# Altium footprint library 2.52-直插元件.PcbLib: 467 footprints (part 14 of 30)
Each footprint in its own frame and in the unit in brackets; x right, y up, seen from the top. Pads: shape width x height; smd on the part's side, far side on the other; paste and mask are expansions set on the pad; w line width, h text height; cw(c..) or ccw(c..) is an arc to the next point about the centre after c.
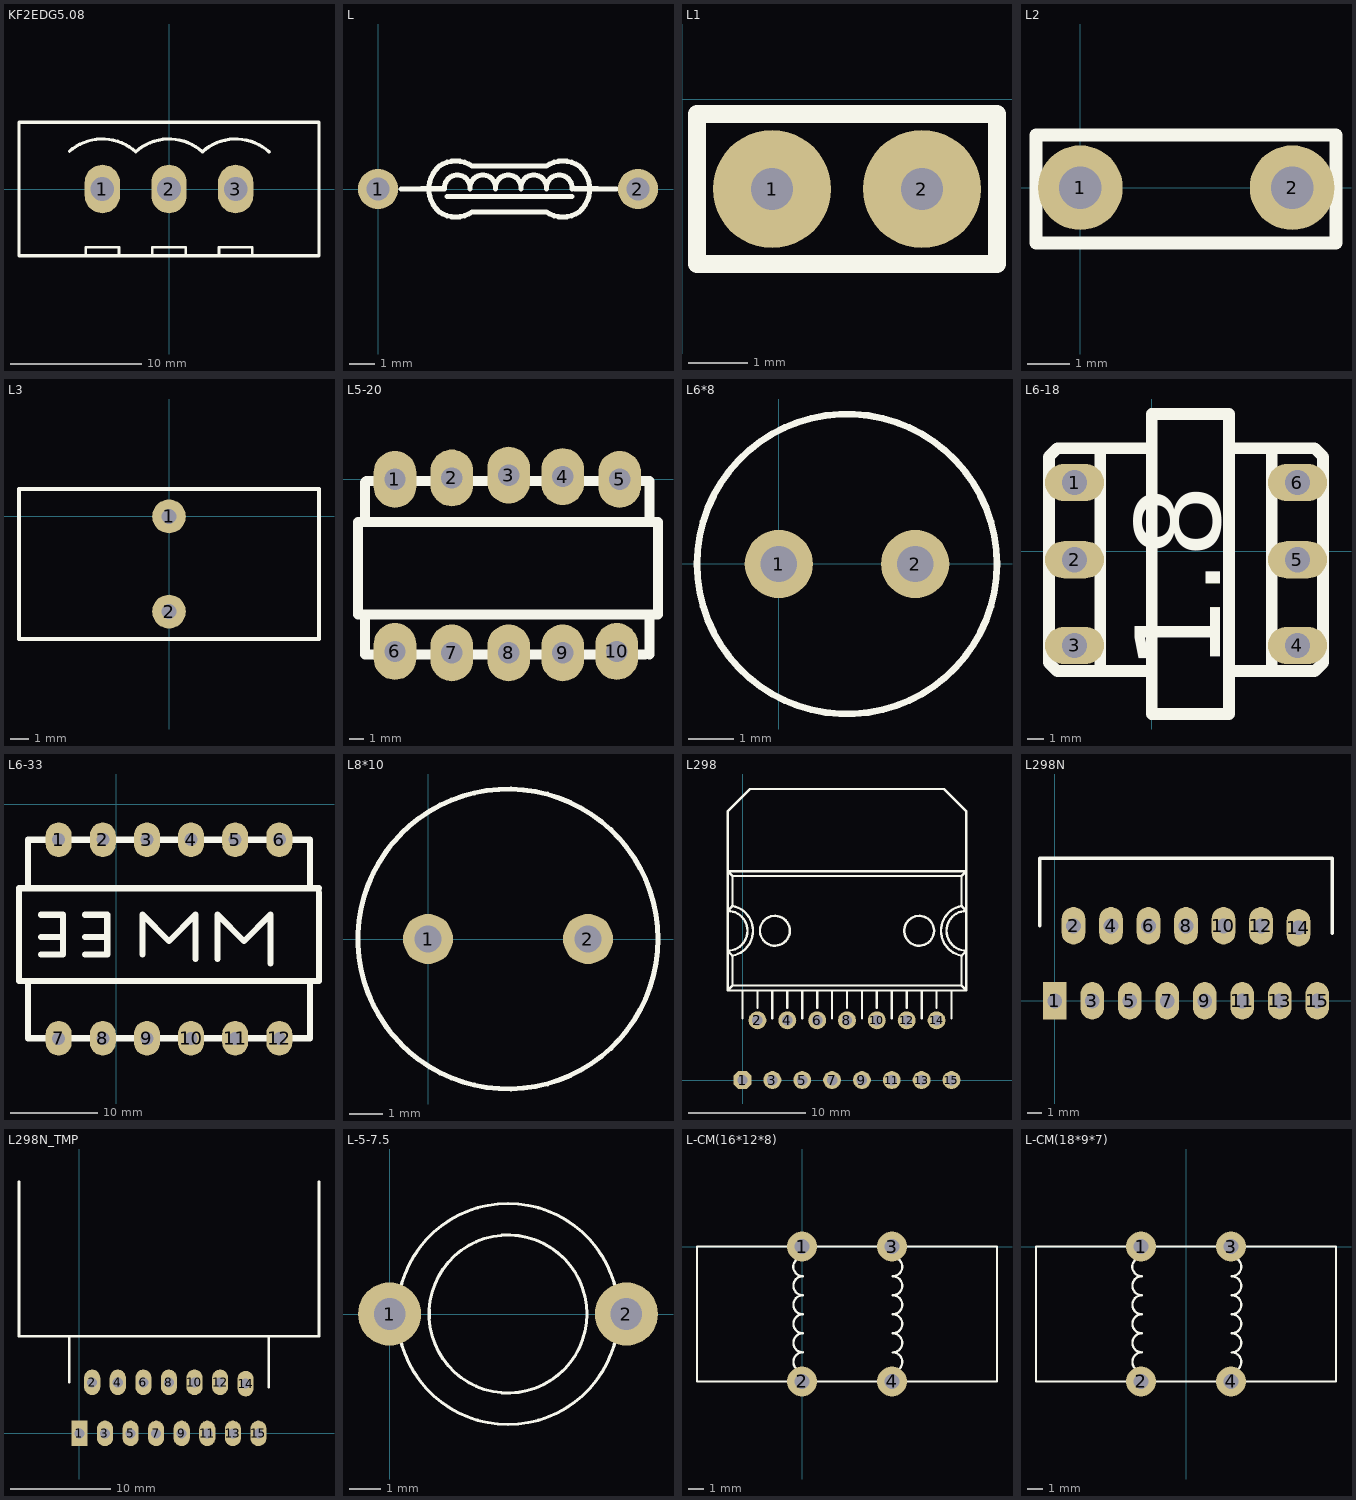
[diagram p13: the footprints below, top view; thin cyan lines are the x and y axes]

## KF2EDG5.08 [mm] "5.08mm端子"
height 12.7
pads (3):
  oval 2.7x3.7 hole 1.8: 1(-5.08,0) 2(0,0) 3(5.08,0)
Top Overlay:
  lines w0.2: -6.35,-5.08 -6.35,-4.445 -3.81,-4.445 -3.81,-5.08 ; -1.27,-5.08 -1.27,-4.445 1.27,-4.445 1.27,-5.08 ; 3.81,-5.08 3.81,-4.445 6.35,-4.445 6.35,-5.08
  lines w0.254: -7.58,2.875 cw(c-5.08,0) -2.517,2.819 ; -2.538,2.842 cw(c0,0) 2.563,2.819 ; 2.542,2.842 cw(c5.08,0) 7.643,2.819 ; -11.43,-5.08 -11.43,5.08 11.43,5.08 11.43,-5.08 -11.43,-5.08

## L [mil]
pads (2):
  round 62 hole 36: 1(0,0) 2(401.57,0)
Top Overlay:
  lines w7.87: 35.75,0 75.75,0 ; 67.32,0.39 102.76,0.39 cw(c122.44,1.97) 142.13,0.39 cw(c161.81,1.97) 181.5,0.39 cw(c201.18,1.97) 220.87,0.39 cw(c240.55,1.97) 260.24,0.39 cw(c279.92,1.97) 299.61,0.39 ; 106.69,-11.42 299.61,-11.42 ; 303.54,0.39 338.98,0.39 ; 328.19,0 368.19,0 ; 94.49,-35.43 cw(c125.98,0) 94.49,35.43 cw(c120.08,-1.97) 145.67,35.43 259.84,35.43 cw(c285.43,-1.97) 311.02,35.43 cw(c279.56,0) 311.02,-35.43 cw(c285.43,1.94) 259.84,-35.43 145.67,-35.43 cw(c120.08,1.94) 94.49,-35.43

## L1 [mil]
pads (2):
  round 78.74 hole 28: 1(60,-60) 2(160,-60)
Top Overlay:
  lines w12: 10,-110 210,-110 210,-10 10,-10 10,-110

## L2 [mm]
pads (2):
  round 2 hole 1: 1(0,0) 2(5,0)
Top Overlay:
  lines w0.305: -1.046,-1.3 -1.046,1.24 6.034,1.24 6.034,-1.3 -1.046,-1.3

## L3 [mm]
pads (2):
  round 1.8 hole 0.8: 1(0,0) 2(0,-5.08)
Top Overlay:
  lines w0.2: -8,-6.54 -8,1.46 8,1.46 8,-6.54 0,-6.54 -8,-6.54

## L5-20 [mm]
pads (10):
  oval 3x4 hole 1.5: 1(-23.2,0) 2(-19.2,0.1) 3(-15.2,0.3) 4(-11.4,0.2) 5(-7.4,0) 6(-23.2,-12.1) 7(-19.2,-12.2) 8(-15.2,-12.2) 9(-11.4,-12.2) 10(-7.6,-12.1)
Top Overlay:
  lines w0.7: -25.3,-9.5 -25.3,-12.3 -5.6,-12.3 ; -25.3,-3 -25.3,-0.2 -25.2,-0.1 -5.3,-0.1 -5.3,-3 ; -5.3,-12.3 -5.3,-9.5 ; -25.8,-9.5 -25.8,-3 ; -25.8,-9.5 -4.7,-9.5 ; -25.8,-9.5 -25.8,-3 ; -25.8,-3 -4.7,-3 ; -4.7,-9.5 -4.7,-3 ; -4.7,-9.5 -4.7,-3

## L6*8 [mm]
pads (2):
  round 1.5 hole 0.8: 1(0,0) 2(3,0)
Top Overlay:
  circle w0.15: c1.5,0 r3.3
3D body "6-8.STEP": height 8, standoff -3.7, extent -1.5,-3 4.5,3

## L6-18 [mm]
pads (6):
  oval 3.5x2.2 hole 1.5: 1(-4.572,4.064) 2(-4.572,-0.508) 3(-4.572,-5.588) 4(8.636,-5.588) 5(8.636,-0.508) 6(8.636,4.064)
Top Overlay:
  lines w0.7: -5.08,-7.112 0,-7.112 ; -4.572,-7.112 -5.588,-7.112 -6.096,-6.604 -6.096,5.588 -5.588,6.096 0,6.096 ; -3.048,-7.112 -3.048,6.096 ; 4.572,-7.112 9.144,-7.112 9.652,-7.112 10.16,-6.604 10.16,5.588 9.652,6.096 9.144,6.096 4.572,6.096 ; 7.112,-7.112 7.112,6.096 ; 0,-9.652 0,8.128 4.572,8.128 4.572,-9.652 0,-9.652
  text "1.8" at 4.064,-7.112 h5.08

## L6-33 [mm]
pads (12):
  oval 3x4 hole 1.5: 1(-6.604,-4.064) 2(-1.524,-4.064) 3(3.556,-4.064) 4(8.636,-4.064) 5(13.716,-4.064) 6(18.796,-4.064) 7(-6.604,-26.924) 8(-1.524,-26.924) 9(3.556,-26.924) 10(8.636,-26.924) 11(13.716,-26.924) 12(18.796,-26.924)
Top Overlay:
  lines w0.7: -10.16,-20.32 -10.16,-26.924 22.352,-26.924 22.352,-20.32 ; -10.16,-9.652 -10.16,-4.064 22.352,-4.064 ; -8.636,-17.272 -8.128,-17.272 -6.096,-17.272 -6.096,-15.24 ; -8.636,-15.24 -6.096,-15.24 ; -8.636,-12.7 -6.096,-12.7 -6.096,-15.24 ; -3.556,-17.272 -1.016,-17.272 -1.016,-12.7 -3.556,-12.7 ; -3.556,-15.24 -1.016,-15.24 ; 3.048,-17.272 3.048,-12.7 6.096,-15.748 9.144,-12.7 9.144,-17.78 ; 11.684,-17.78 11.684,-12.7 14.732,-15.748 17.78,-12.7 17.78,-18.288 ; 23.368,-10.16 23.368,-20.32 -11.176,-20.32 -11.176,-9.652 23.368,-9.652 ; 22.352,-4.064 22.352,-9.652 22.352,-4.064

## L8*10 [mm]
pads (2):
  round 1.5 hole 0.8: 1(0,0) 2(4.8,0)
Top Overlay:
  circle w0.15: c2.4,0 r4.5
3D body "User Library-inductor-1.STEP": height 10.92, standoff -7, extent -1.1,-3.5 5.9,3.5

## L298 [mil] "L298"
height 10
pads (15):
  oct 60x60 hole 35: 1(0,0)
  round 60 hole 35: 2(50,200) 3(100,0) 4(150,200) 5(200,0) 6(250,200) 7(300,0) 8(350,200) 9(400,0) 10(450,200) 11(500,0) 12(550,200) 13(600,0) 14(650,200) 15(700,0)
Top Overlay:
  circle w8: c108.33,500 r50
  circle w8: c591.67,500 r50
  lines w7.87: -50,433.33 -33.33,416.67 -33.33,316.67 ; -50,566.67 -33.33,583.33 -33.33,683.33 ; 0,207.48 0,300 ; 50,241.67 50,300 ; 100,207.48 100,300 ; 150,241.67 150,300 ; 200,207.48 200,300 ; 250,241.67 250,300 ; 300,207.48 300,300 ; 350,241.67 350,300 ; 400,207.48 400,300 ; 450,241.67 450,300 ; 500,207.48 500,300 ; 550,241.67 550,300 ; 600,207.48 600,300 ; 650,241.67 650,300 ; 700,207.48 700,300 ; 750,433.33 733.33,416.67 733.33,316.67 ; 750,566.67 733.33,583.33 733.33,683.33 ; -50,300 -50,700 ; -50,300 750,300 ; -50,300 -33.33,316.67 ; -50,700 -50,900 25,975 675,975 750,900 750,700 ; -50,700 750,700 ; -50,700 -33.33,683.33 ; -33.33,316.67 733.33,316.67 ; -33.33,683.33 733.33,683.33 ; 733.33,316.67 750,300 ; 733.33,683.33 750,700 ; 750,300 750,700
  lines w8: -50,433.33 ccw(c-50,500) -50,566.67 ; -33.78,416.56 ccw(c-50,500) -33.78,583.44 ; 733.78,416.56 cw(c750,500) 733.78,583.44 ; 750,433.33 cw(c750,500) 750,566.67

## L298N [mm]
pads (15):
  rect 1.6x2.54 hole 1: 1(0,0)
  oval 1.6x2.54 hole 1: 2(1.27,5.08) 3(2.54,0) 4(3.81,5.08) 5(5.08,0) 6(6.35,5.08) 7(7.62,0) 8(8.89,5.08) 9(10.16,0) 10(11.43,5.08) 11(12.7,0) 12(13.97,5.08) 13(15.24,0) 14(16.51,4.953) 15(17.78,0)
Top Overlay:
  lines w0.254: -1.016,5.08 -1.016,9.652 18.796,9.652 18.796,4.572

## L298N_TMP [mm]
pads (15):
  rect 1.6x2.54 hole 1: 1(0,0)
  oval 1.6x2.54 hole 1: 2(1.27,5.08) 3(2.54,0) 4(3.81,5.08) 5(5.08,0) 6(6.35,5.08) 7(7.62,0) 8(8.89,5.08) 9(10.16,0) 10(11.43,5.08) 11(12.7,0) 12(13.97,5.08) 13(15.24,0) 14(16.51,4.953) 15(17.78,0)
Top Overlay:
  lines w0.254: -6,25 -6,9.652 23.796,9.652 23.796,25 ; -1.016,5.08 -1.016,9.652 ; 18.796,4.572 18.796,9.652

## L-5-7.5 [mm] "淘宝ID:黄晶宝石   店铺网址:https://shop463601444.taobao.com"
pads (2):
  round 2 hole 1: 1(0,0) 2(7.5,0)
Top Overlay:
  circle w0.1: c3.75,0 r3.5
  circle w0.1: c3.75,0 r2.5
3D body "变?": height 15, standoff -7.6, extent -1.088,-4.313 8.588,4.685

## L-CM(16*12*8) [mm]
pads (4):
  round 2 hole 1: 1(0,0) 2(0,-9) 3(6,0) 4(6,-9)
Top Overlay:
  lines w0.15: 0.057,-1.982 cw(c0.057,-1.347) 0.057,-0.712 ; 0.059,-7.059 cw(c0.059,-6.424) 0.059,-5.789 cw(c0.059,-5.154) 0.059,-4.519 ; 0.058,-4.52 cw(c0.058,-3.885) 0.058,-3.25 ; 0.058,-3.251 cw(c0.058,-2.616) 0.058,-1.981 ; 0.06,-8.328 cw(c0.06,-7.693) 0.06,-7.058 ; 6.047,-4.523 ccw(c6.047,-3.888) 6.047,-3.253 ccw(c6.047,-2.618) 6.047,-1.983 ; 6.046,-1.984 ccw(c6.046,-1.349) 6.046,-0.714 ; 6.048,-7.061 ccw(c6.048,-6.426) 6.048,-5.791 ; 6.048,-5.792 ccw(c6.048,-5.157) 6.048,-4.522 ; 6.049,-8.33 ccw(c6.049,-7.695) 6.049,-7.06 ; -7,-9 13,-9 13,0 -7,0 -7,-9
3D body "变?": height 16.27, standoff -5.58, extent -5.775,-9.446 11.775,0.446

## L-CM(18*9*7) [mm]
pads (4):
  round 2 hole 1: 1(-3,0) 2(-3,-9) 3(3,0) 4(3,-9)
Top Overlay:
  lines w0.15: -2.942,-4.52 cw(c-2.942,-3.885) -2.942,-3.25 ; -2.942,-3.251 cw(c-2.942,-2.616) -2.942,-1.981 ; -2.943,-1.982 cw(c-2.943,-1.347) -2.943,-0.712 ; -2.941,-7.059 cw(c-2.941,-6.424) -2.941,-5.789 cw(c-2.941,-5.154) -2.941,-4.519 ; -2.94,-8.328 cw(c-2.94,-7.693) -2.94,-7.058 ; 3.046,-1.984 ccw(c3.046,-1.349) 3.046,-0.714 ; 3.047,-4.523 ccw(c3.047,-3.888) 3.047,-3.253 ccw(c3.047,-2.618) 3.047,-1.983 ; 3.048,-7.061 ccw(c3.048,-6.426) 3.048,-5.791 ; 3.048,-5.792 ccw(c3.048,-5.157) 3.048,-4.522 ; 3.049,-8.33 ccw(c3.049,-7.695) 3.049,-7.06 ; -10,-9 -10,0 10,0 10,-9 -10,-9
3D body "变?": height 16.27, standoff -5.58, extent -8.775,-9.446 8.775,0.446